# Altium footprint library mastermind.PCBLIB: 1061 footprints (part 67 of 67)
Each footprint in its own frame and in the unit in brackets; x right, y up, seen from the top. Pads: shape width x height; smd on the part's side, far side on the other; paste and mask are expansions set on the pad; w line width, h text height; cw(c..) or ccw(c..) is an arc to the next point about the centre after c.
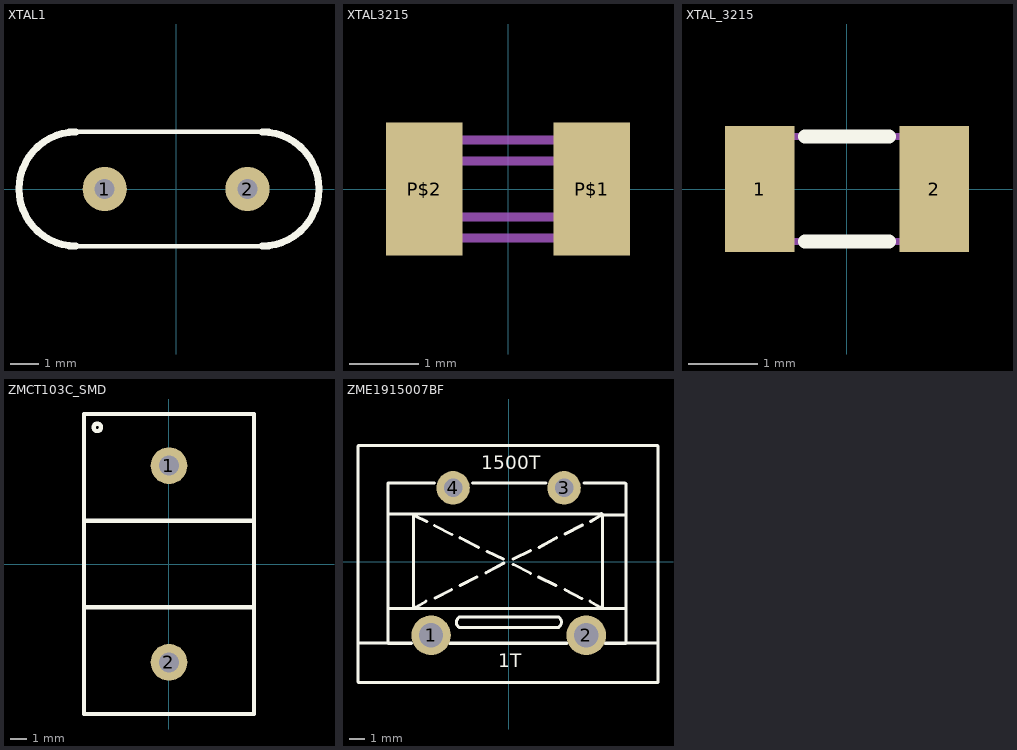
[diagram p66: the footprints below, top view; thin cyan lines are the x and y axes]

## XTAL1 [mil]
height 78.74
pads (2):
  round 62 hole 28: 1(-100,0) 2(100,0)
Top Overlay:
  lines w6.3: -140,-80 120,-80 ; -140,80 120,80
  lines w10: -140,-80 cw(c-140,0) -140,80 ; 120,-80 ccw(c120,0) 120,80
3D body "Crystal Oscillator.stp": height 131.89, standoff -112.2, extent -227,-91.14 204.1,89.96

## XTAL3215 [mm]
pads (2):
  rect 1.1x1.9 smd: P$1(1.2,0) P$2(-1.2,0)
Mechanical 2:
  lines w0.127: -1.6,-0.417 ccw(c-1.317,-0.417) -1.317,-0.7 1.317,-0.7 ccw(c1.317,-0.417) 1.6,-0.417 1.6,0.384 ccw(c1.284,0.384) 1.284,0.7 -1.376,0.7 ccw(c-1.376,0.477) -1.6,0.477 -1.6,-0.417 ; -1.3,-0.2 ccw(c-1.05,-0.15) -1,-0.4 1,-0.4 ccw(c1,-0.1) 1.3,-0.1 1.3,0.1 ccw(c1,0.1) 1,0.4 -1.1,0.4 ccw(c-1.05,0.15) -1.3,0.1 -1.3,-0.2

## XTAL_3215 [mm]
pads (2):
  rect 1x1.8 smd: 1(-1.25,0) 2(1.25,0)
Top Overlay:
  lines w0.2: -0.6,-0.75 0.6,-0.75 ; -0.6,0.75 0.6,0.75
Mechanical 3:
  lines w0.1: -1.6,-0.55 cw(c-1.6,-0.75) -1.4,-0.75 1.4,-0.75 cw(c1.6,-0.75) 1.6,-0.55 1.6,0.55 cw(c1.6,0.75) 1.4,0.75 -1.4,0.75 cw(c-1.6,0.75) -1.6,0.55 -1.6,-0.55
3D body "User Library-Siward_SX3215.step": height 0.81, standoff 0, extent -1.6,-0.75 1.6,0.75
3D body: height 0.81, standoff 0.15, extent -1.2,-0.6 1.2,0.6

## ZMCT103C_SMD [mm]
pads (2):
  round 2.2 hole 1.2: 1(0,5.9) 2(0,-5.9)
Top Overlay:
  circle w0.254: c-4.3,8.2 r0.224
  lines w0.254: -5.1,-2.6 5.1,-2.6 ; -5.1,2.6 5.1,2.6 ; -5.1,-9 5.1,-9 5.1,9 -5.1,9 -5.1,-9
3D body "ZMCT103C.stp": height 19, standoff -3.9, extent -5,-9 5,9

## ZME1915007BF [mm]
pads (4):
  round 2.6 hole 1.6: 1(-5.1,-4.85) 2(5.1,-4.85)
  round 2.2 hole 1.2: 3(3.65,4.85) 4(-3.65,4.85)
Top Overlay:
  lines w0.2: -9.825,-5.339 -6.396,-5.339 ; -7.841,-3.077 7.677,-3.077 7.677,-3.116 ; -7.841,3.115 6.169,3.115 6.169,-2.957 ; -6.396,-5.378 -7.92,-5.378 -7.92,5.178 -4.864,5.178 ; -6.332,-3.077 -6.253,-3.077 -6.253,3.115 ; -6.134,2.996 -5.38,2.638 ; -6.094,-2.997 -5.42,-2.6 ; -4.864,2.361 -3.713,1.765 ; -4.824,-2.402 -3.753,-1.846 ; -3.896,-5.378 3.85,-5.378 ; -3.896,-5.339 3.85,-5.339 ; -3.26,-3.649 3.293,-3.649 ; -3.256,-4.317 cw(c-3.056,-3.994) -3.249,-3.667 ; -3.256,-4.324 3.297,-4.324 ; -3.197,-1.568 -2.086,-1.013 ; -3.197,1.567 -1.967,0.932 ; -2.364,5.178 2.45,5.178 ; -1.491,-0.735 -0.3,-0.1 ; -1.411,0.654 -0.34,0.178 ; 0.295,-0.179 1.446,-0.775 ; 0.295,0.178 1.446,0.733 ; 1.962,-1.013 3.113,-1.568 ; 2.002,0.932 3.153,1.567 ; 3.286,-4.306 ccw(c3.093,-3.979) 3.293,-3.656 ; 3.708,-1.846 4.82,-2.442 ; 3.708,1.805 4.859,2.4 ; 4.95,5.178 7.638,5.178 7.598,5.178 ; 5.336,-2.6 6.01,-2.997 ; 5.375,2.638 6.129,3.075 ; 6.09,3.154 6.09,3.075 7.677,3.075 ; 6.35,-5.378 7.717,-5.378 7.717,5.139 ; 6.35,-5.339 9.741,-5.339 9.741,-5.378 ; 9.741,7.639 -9.865,7.639 -9.904,7.599 -9.904,-7.918 -9.865,-7.958 9.82,-7.958 9.82,7.599 9.781,7.639
  text "1500T" at -1.794,5.764 h1.52
  text "1T" at -0.668,-7.246 h1.52